# Altium integrated library Weidmueller_OMNIMATE_Power.IntLib: 508 symbols (part 6 of 9)
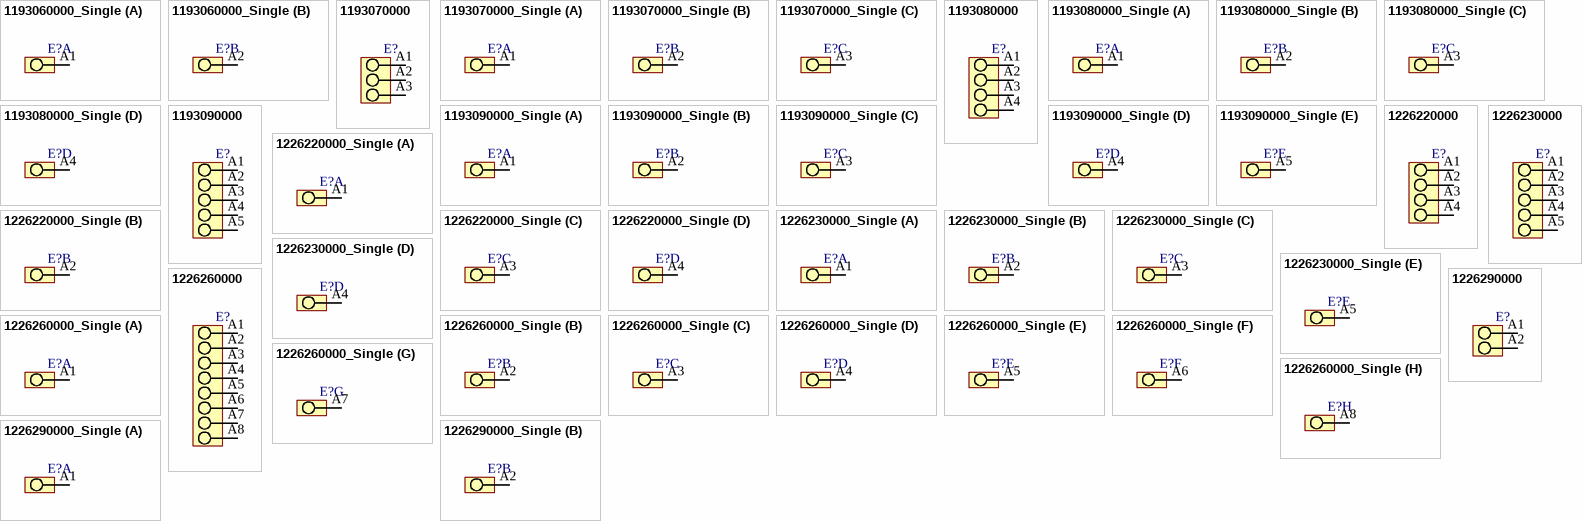
[diagram p36: symbols 1193060000_Single to 1226290000_Single]

## 1193090000_Single
designator E?
OMNIMATE Power - series LUP; PartNumber: 1193090000; Manufacturer: Weidmueller; Short_text_for_material: LUP 10.16/05/90V 3.2SN GY BX; Side_termination_characteristic: closed side; Mounting_onto_the_PCB: Solder connection; Pitch_mm: 10,16 mm; Pitch_inch: 0,4 inch; No_of_poles: 5; Solder_pin_length_mm: 3,2 mm; Contact_material: E-Cu; Contact_surface: tinned; Insulating_material: Wemid (PA); UL_94_flammability_rating: V-0; Rated_voltage_for_surge_voltage_class_pollution_degree_II_2: 1000 V; Rated_current_min_no_of_poles_TU_20_deg_C: 76 A; Solid_min_H05_07_V_U: 0,5 mm²; Solid_max_H05_07_V_U: 16 mm²; Rated_voltage_use_group_B_UL_1059: 600 V; Rated_current_use_group_B_UL_1059: 51 A; Wire_cross_section_AWG_min_UL_1059: AWG 22; Wire_cross_section_AWG_max_UL_1059: AWG 6; PackageReference: LUP_10_16_90V_05; Colour: Pebble grey; Packaging: Box; Qty: 20 PCS; Revision: V1; ComponentLink1Description: Manufacturer URL; ComponentLink1URL: http://www.weidmueller.com/; ComponentLink2Description: URL Link1; ComponentLink2URL: http://catalog.weidmueller.com/catalog/Start.do?localeId=en&ObjectID=1193090000
footprint LUP_10_16_90V_05 (OMNIMATE Power - Serie LUP  LUP 10.16/05/90V 3.2)
part A pins: A1
part B pins: A2
part C pins: A3
part D pins: A4
part E pins: A5
1 alternate drawing of the same symbol

## 1226220000
designator E?
OMNIMATE Power - series LU; PartNumber: 1226220000; Manufacturer: Weidmueller; Short_text_for_material: LU 10.16/04/90 4.5SN BK BX; Side_termination_characteristic: closed side; Mounting_onto_the_PCB: Solder connection; Pitch_mm: 10,16 mm; Pitch_inch: 0,4 inch; No_of_poles: 4; Solder_pin_length_mm: 4,5 mm; Contact_material: E-Cu; Contact_surface: tinned; Insulating_material: Wemid (PA); UL_94_flammability_rating: V-0; Rated_voltage_for_surge_voltage_class_pollution_degree_II_2: 1000 V; Solid_min_H05_07_V_U: 0,5 mm²; Solid_max_H05_07_V_U: 16 mm²; Rated_voltage_use_group_B_UL_1059: 300 V; Rated_current_use_group_B_UL_1059: 65 A; Wire_cross_section_AWG_min_UL_1059: AWG 26; Wire_cross_section_AWG_max_UL_1059: AWG 6; PackageReference: LU_10_16_90_04; Colour: Black; Packaging: Box; Qty: 20 PCS; Revision: V1; ComponentLink1Description: Manufacturer URL; ComponentLink1URL: http://www.weidmueller.com/; ComponentLink2Description: URL Link1; ComponentLink2URL: http://catalog.weidmueller.com/catalog/Start.do?localeId=en&ObjectID=1226220000
footprint LU_10_16_90_04 (OMNIMATE Power - Serie LU  LU 10.16/04/90 4.5)
pins: A1, A2, A3, A4
1 alternate drawing of the same symbol

## 1226220000_Single
designator E?
OMNIMATE Power - series LU; PartNumber: 1226220000; Manufacturer: Weidmueller; Short_text_for_material: LU 10.16/04/90 4.5SN BK BX; Side_termination_characteristic: closed side; Mounting_onto_the_PCB: Solder connection; Pitch_mm: 10,16 mm; Pitch_inch: 0,4 inch; No_of_poles: 4; Solder_pin_length_mm: 4,5 mm; Contact_material: E-Cu; Contact_surface: tinned; Insulating_material: Wemid (PA); UL_94_flammability_rating: V-0; Rated_voltage_for_surge_voltage_class_pollution_degree_II_2: 1000 V; Solid_min_H05_07_V_U: 0,5 mm²; Solid_max_H05_07_V_U: 16 mm²; Rated_voltage_use_group_B_UL_1059: 300 V; Rated_current_use_group_B_UL_1059: 65 A; Wire_cross_section_AWG_min_UL_1059: AWG 26; Wire_cross_section_AWG_max_UL_1059: AWG 6; PackageReference: LU_10_16_90_04; Colour: Black; Packaging: Box; Qty: 20 PCS; Revision: V1; ComponentLink1Description: Manufacturer URL; ComponentLink1URL: http://www.weidmueller.com/; ComponentLink2Description: URL Link1; ComponentLink2URL: http://catalog.weidmueller.com/catalog/Start.do?localeId=en&ObjectID=1226220000
footprint LU_10_16_90_04 (OMNIMATE Power - Serie LU  LU 10.16/04/90 4.5)
part A pins: A1
part B pins: A2
part C pins: A3
part D pins: A4
1 alternate drawing of the same symbol

## 1226230000
designator E?
OMNIMATE Power - series LU; PartNumber: 1226230000; Manufacturer: Weidmueller; Short_text_for_material: LU 10.16/05/90 4.5SN BK BX; Side_termination_characteristic: closed side; Mounting_onto_the_PCB: Solder connection; Pitch_mm: 10,16 mm; Pitch_inch: 0,4 inch; No_of_poles: 5; Solder_pin_length_mm: 4,5 mm; Contact_material: E-Cu; Contact_surface: tinned; Insulating_material: Wemid (PA); UL_94_flammability_rating: V-0; Rated_voltage_for_surge_voltage_class_pollution_degree_II_2: 1000 V; Solid_min_H05_07_V_U: 0,5 mm²; Solid_max_H05_07_V_U: 16 mm²; Rated_voltage_use_group_B_UL_1059: 300 V; Rated_current_use_group_B_UL_1059: 65 A; Wire_cross_section_AWG_min_UL_1059: AWG 26; Wire_cross_section_AWG_max_UL_1059: AWG 6; PackageReference: LU_10_16_90_05; Colour: Black; Packaging: Box; Qty: 20 PCS; Revision: V1; ComponentLink1Description: Manufacturer URL; ComponentLink1URL: http://www.weidmueller.com/; ComponentLink2Description: URL Link1; ComponentLink2URL: http://catalog.weidmueller.com/catalog/Start.do?localeId=en&ObjectID=1226230000
footprint LU_10_16_90_05 (OMNIMATE Power - Serie LU  LU 10.16/05/90 4.5)
pins: A1, A2, A3, A4, A5
1 alternate drawing of the same symbol

## 1226230000_Single
designator E?
OMNIMATE Power - series LU; PartNumber: 1226230000; Manufacturer: Weidmueller; Short_text_for_material: LU 10.16/05/90 4.5SN BK BX; Side_termination_characteristic: closed side; Mounting_onto_the_PCB: Solder connection; Pitch_mm: 10,16 mm; Pitch_inch: 0,4 inch; No_of_poles: 5; Solder_pin_length_mm: 4,5 mm; Contact_material: E-Cu; Contact_surface: tinned; Insulating_material: Wemid (PA); UL_94_flammability_rating: V-0; Rated_voltage_for_surge_voltage_class_pollution_degree_II_2: 1000 V; Solid_min_H05_07_V_U: 0,5 mm²; Solid_max_H05_07_V_U: 16 mm²; Rated_voltage_use_group_B_UL_1059: 300 V; Rated_current_use_group_B_UL_1059: 65 A; Wire_cross_section_AWG_min_UL_1059: AWG 26; Wire_cross_section_AWG_max_UL_1059: AWG 6; PackageReference: LU_10_16_90_05; Colour: Black; Packaging: Box; Qty: 20 PCS; Revision: V1; ComponentLink1Description: Manufacturer URL; ComponentLink1URL: http://www.weidmueller.com/; ComponentLink2Description: URL Link1; ComponentLink2URL: http://catalog.weidmueller.com/catalog/Start.do?localeId=en&ObjectID=1226230000
footprint LU_10_16_90_05 (OMNIMATE Power - Serie LU  LU 10.16/05/90 4.5)
part A pins: A1
part B pins: A2
part C pins: A3
part D pins: A4
part E pins: A5
1 alternate drawing of the same symbol

## 1226260000
designator E?
OMNIMATE Power - series LU; PartNumber: 1226260000; Manufacturer: Weidmueller; Short_text_for_material: LU 10.16/08/90 4.5SN BK BX; Side_termination_characteristic: closed side; Mounting_onto_the_PCB: Solder connection; Pitch_mm: 10,16 mm; Pitch_inch: 0,4 inch; No_of_poles: 8; Solder_pin_length_mm: 4,5 mm; Contact_material: E-Cu; Contact_surface: tinned; Insulating_material: Wemid (PA); UL_94_flammability_rating: V-0; Rated_voltage_for_surge_voltage_class_pollution_degree_II_2: 1000 V; Solid_min_H05_07_V_U: 0,5 mm²; Solid_max_H05_07_V_U: 16 mm²; Rated_voltage_use_group_B_UL_1059: 300 V; Rated_current_use_group_B_UL_1059: 65 A; Wire_cross_section_AWG_min_UL_1059: AWG 26; Wire_cross_section_AWG_max_UL_1059: AWG 6; PackageReference: LU_10_16_90_08; Colour: Black; Packaging: Box; Qty: 20 PCS; Revision: V1; ComponentLink1Description: Manufacturer URL; ComponentLink1URL: http://www.weidmueller.com/; ComponentLink2Description: URL Link1; ComponentLink2URL: http://catalog.weidmueller.com/catalog/Start.do?localeId=en&ObjectID=1226260000
footprint LU_10_16_90_08 (OMNIMATE Power - Serie LU  LU 10.16/08/90 4.5)
pins: A1, A2, A3, A4, A5, A6, A7, A8
1 alternate drawing of the same symbol

## 1226260000_Single
designator E?
OMNIMATE Power - series LU; PartNumber: 1226260000; Manufacturer: Weidmueller; Short_text_for_material: LU 10.16/08/90 4.5SN BK BX; Side_termination_characteristic: closed side; Mounting_onto_the_PCB: Solder connection; Pitch_mm: 10,16 mm; Pitch_inch: 0,4 inch; No_of_poles: 8; Solder_pin_length_mm: 4,5 mm; Contact_material: E-Cu; Contact_surface: tinned; Insulating_material: Wemid (PA); UL_94_flammability_rating: V-0; Rated_voltage_for_surge_voltage_class_pollution_degree_II_2: 1000 V; Solid_min_H05_07_V_U: 0,5 mm²; Solid_max_H05_07_V_U: 16 mm²; Rated_voltage_use_group_B_UL_1059: 300 V; Rated_current_use_group_B_UL_1059: 65 A; Wire_cross_section_AWG_min_UL_1059: AWG 26; Wire_cross_section_AWG_max_UL_1059: AWG 6; PackageReference: LU_10_16_90_08; Colour: Black; Packaging: Box; Qty: 20 PCS; Revision: V1; ComponentLink1Description: Manufacturer URL; ComponentLink1URL: http://www.weidmueller.com/; ComponentLink2Description: URL Link1; ComponentLink2URL: http://catalog.weidmueller.com/catalog/Start.do?localeId=en&ObjectID=1226260000
footprint LU_10_16_90_08 (OMNIMATE Power - Serie LU  LU 10.16/08/90 4.5)
part A pins: A1
part B pins: A2
part C pins: A3
part D pins: A4
part E pins: A5
part F pins: A6
part G pins: A7
part H pins: A8
1 alternate drawing of the same symbol

## 1226290000
designator E?
OMNIMATE Power - series LUP; PartNumber: 1226290000; Manufacturer: Weidmueller; Short_text_for_material: LUP 10.16/02/90 3.2SN BK BX; Side_termination_characteristic: closed side; Mounting_onto_the_PCB: Solder connection; Pitch_mm: 10,16 mm; Pitch_inch: 0,4 inch; No_of_poles: 2; Solder_pin_length_mm: 3,2 mm; Contact_material: E-Cu; Contact_surface: tinned; Insulating_material: Wemid (PA); UL_94_flammability_rating: V-0; Rated_voltage_for_surge_voltage_class_pollution_degree_II_2: 1000 V; Solid_min_H05_07_V_U: 0,5 mm²; Solid_max_H05_07_V_U: 16 mm²; Rated_voltage_use_group_B_UL_1059: 300 V; Rated_current_use_group_B_UL_1059: 58 A; Wire_cross_section_AWG_min_UL_1059: AWG 26; Wire_cross_section_AWG_max_UL_1059: AWG 6; PackageReference: LUP_10_16_90_02; Colour: Black; Packaging: Box; Qty: 20 PCS; Revision: V1; ComponentLink1Description: Manufacturer URL; ComponentLink1URL: http://www.weidmueller.com/; ComponentLink2Description: URL Link1; ComponentLink2URL: http://catalog.weidmueller.com/catalog/Start.do?localeId=en&ObjectID=1226290000
footprint LUP_10_16_90_02 (OMNIMATE Power - Serie LUP  LUP 10.16/02/90 3.2)
pins: A1, A2
1 alternate drawing of the same symbol

## 1226290000_Single
designator E?
OMNIMATE Power - series LUP; PartNumber: 1226290000; Manufacturer: Weidmueller; Short_text_for_material: LUP 10.16/02/90 3.2SN BK BX; Side_termination_characteristic: closed side; Mounting_onto_the_PCB: Solder connection; Pitch_mm: 10,16 mm; Pitch_inch: 0,4 inch; No_of_poles: 2; Solder_pin_length_mm: 3,2 mm; Contact_material: E-Cu; Contact_surface: tinned; Insulating_material: Wemid (PA); UL_94_flammability_rating: V-0; Rated_voltage_for_surge_voltage_class_pollution_degree_II_2: 1000 V; Solid_min_H05_07_V_U: 0,5 mm²; Solid_max_H05_07_V_U: 16 mm²; Rated_voltage_use_group_B_UL_1059: 300 V; Rated_current_use_group_B_UL_1059: 58 A; Wire_cross_section_AWG_min_UL_1059: AWG 26; Wire_cross_section_AWG_max_UL_1059: AWG 6; PackageReference: LUP_10_16_90_02; Colour: Black; Packaging: Box; Qty: 20 PCS; Revision: V1; ComponentLink1Description: Manufacturer URL; ComponentLink1URL: http://www.weidmueller.com/; ComponentLink2Description: URL Link1; ComponentLink2URL: http://catalog.weidmueller.com/catalog/Start.do?localeId=en&ObjectID=1226290000
footprint LUP_10_16_90_02 (OMNIMATE Power - Serie LUP  LUP 10.16/02/90 3.2)
part A pins: A1
part B pins: A2
1 alternate drawing of the same symbol

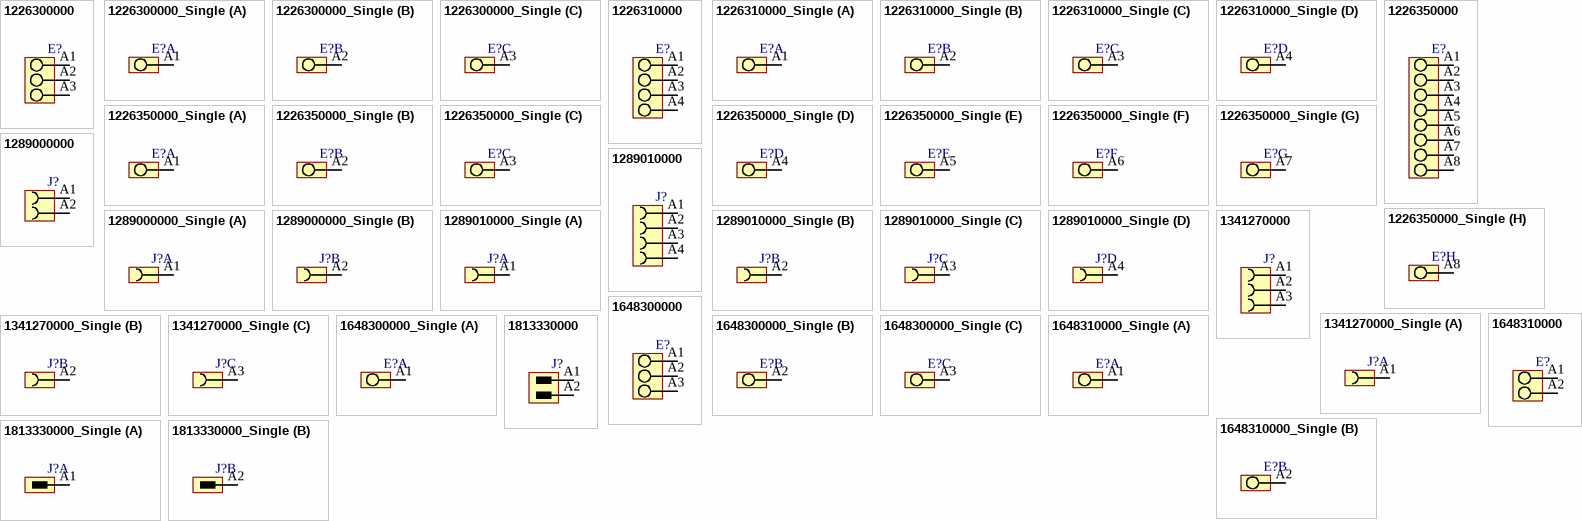
[diagram p20: symbols 1226300000 to 1813330000_Single]

## 1226300000
designator E?
OMNIMATE Power - series LUP; PartNumber: 1226300000; Manufacturer: Weidmueller; Short_text_for_material: LUP 10.16/03/90 3.2SN BK BX; Side_termination_characteristic: closed side; Mounting_onto_the_PCB: Solder connection; Pitch_mm: 10,16 mm; Pitch_inch: 0,4 inch; No_of_poles: 3; Solder_pin_length_mm: 3,2 mm; Contact_material: E-Cu; Contact_surface: tinned; Insulating_material: Wemid (PA); UL_94_flammability_rating: V-0; Rated_voltage_for_surge_voltage_class_pollution_degree_II_2: 1000 V; Solid_min_H05_07_V_U: 0,5 mm²; Solid_max_H05_07_V_U: 16 mm²; Rated_voltage_use_group_B_UL_1059: 300 V; Rated_current_use_group_B_UL_1059: 58 A; Wire_cross_section_AWG_min_UL_1059: AWG 26; Wire_cross_section_AWG_max_UL_1059: AWG 6; PackageReference: LUP_10_16_90_03; Colour: Black; Packaging: Box; Qty: 20 PCS; Revision: V1; ComponentLink1Description: Manufacturer URL; ComponentLink1URL: http://www.weidmueller.com/; ComponentLink2Description: URL Link1; ComponentLink2URL: http://catalog.weidmueller.com/catalog/Start.do?localeId=en&ObjectID=1226300000
footprint LUP_10_16_90_03 (OMNIMATE Power - Serie LUP  LUP 10.16/03/90 3.2)
pins: A1, A2, A3
1 alternate drawing of the same symbol

## 1226300000_Single
designator E?
OMNIMATE Power - series LUP; PartNumber: 1226300000; Manufacturer: Weidmueller; Short_text_for_material: LUP 10.16/03/90 3.2SN BK BX; Side_termination_characteristic: closed side; Mounting_onto_the_PCB: Solder connection; Pitch_mm: 10,16 mm; Pitch_inch: 0,4 inch; No_of_poles: 3; Solder_pin_length_mm: 3,2 mm; Contact_material: E-Cu; Contact_surface: tinned; Insulating_material: Wemid (PA); UL_94_flammability_rating: V-0; Rated_voltage_for_surge_voltage_class_pollution_degree_II_2: 1000 V; Solid_min_H05_07_V_U: 0,5 mm²; Solid_max_H05_07_V_U: 16 mm²; Rated_voltage_use_group_B_UL_1059: 300 V; Rated_current_use_group_B_UL_1059: 58 A; Wire_cross_section_AWG_min_UL_1059: AWG 26; Wire_cross_section_AWG_max_UL_1059: AWG 6; PackageReference: LUP_10_16_90_03; Colour: Black; Packaging: Box; Qty: 20 PCS; Revision: V1; ComponentLink1Description: Manufacturer URL; ComponentLink1URL: http://www.weidmueller.com/; ComponentLink2Description: URL Link1; ComponentLink2URL: http://catalog.weidmueller.com/catalog/Start.do?localeId=en&ObjectID=1226300000
footprint LUP_10_16_90_03 (OMNIMATE Power - Serie LUP  LUP 10.16/03/90 3.2)
part A pins: A1
part B pins: A2
part C pins: A3
1 alternate drawing of the same symbol

## 1226310000
designator E?
OMNIMATE Power - series LUP; PartNumber: 1226310000; Manufacturer: Weidmueller; Short_text_for_material: LUP 10.16/04/90 3.2SN BK BX; Side_termination_characteristic: closed side; Mounting_onto_the_PCB: Solder connection; Pitch_mm: 10,16 mm; Pitch_inch: 0,4 inch; No_of_poles: 4; Solder_pin_length_mm: 3,2 mm; Contact_material: E-Cu; Contact_surface: tinned; Insulating_material: Wemid (PA); UL_94_flammability_rating: V-0; Rated_voltage_for_surge_voltage_class_pollution_degree_II_2: 1000 V; Solid_min_H05_07_V_U: 0,5 mm²; Solid_max_H05_07_V_U: 16 mm²; Rated_voltage_use_group_B_UL_1059: 300 V; Rated_current_use_group_B_UL_1059: 58 A; Wire_cross_section_AWG_min_UL_1059: AWG 26; Wire_cross_section_AWG_max_UL_1059: AWG 6; PackageReference: LUP_10_16_90_04; Colour: Black; Packaging: Box; Qty: 20 PCS; Revision: V1; ComponentLink1Description: Manufacturer URL; ComponentLink1URL: http://www.weidmueller.com/; ComponentLink2Description: URL Link1; ComponentLink2URL: http://catalog.weidmueller.com/catalog/Start.do?localeId=en&ObjectID=1226310000
footprint LUP_10_16_90_04 (OMNIMATE Power - Serie LUP  LUP 10.16/04/90 3.2)
pins: A1, A2, A3, A4
1 alternate drawing of the same symbol

## 1226310000_Single
designator E?
OMNIMATE Power - series LUP; PartNumber: 1226310000; Manufacturer: Weidmueller; Short_text_for_material: LUP 10.16/04/90 3.2SN BK BX; Side_termination_characteristic: closed side; Mounting_onto_the_PCB: Solder connection; Pitch_mm: 10,16 mm; Pitch_inch: 0,4 inch; No_of_poles: 4; Solder_pin_length_mm: 3,2 mm; Contact_material: E-Cu; Contact_surface: tinned; Insulating_material: Wemid (PA); UL_94_flammability_rating: V-0; Rated_voltage_for_surge_voltage_class_pollution_degree_II_2: 1000 V; Solid_min_H05_07_V_U: 0,5 mm²; Solid_max_H05_07_V_U: 16 mm²; Rated_voltage_use_group_B_UL_1059: 300 V; Rated_current_use_group_B_UL_1059: 58 A; Wire_cross_section_AWG_min_UL_1059: AWG 26; Wire_cross_section_AWG_max_UL_1059: AWG 6; PackageReference: LUP_10_16_90_04; Colour: Black; Packaging: Box; Qty: 20 PCS; Revision: V1; ComponentLink1Description: Manufacturer URL; ComponentLink1URL: http://www.weidmueller.com/; ComponentLink2Description: URL Link1; ComponentLink2URL: http://catalog.weidmueller.com/catalog/Start.do?localeId=en&ObjectID=1226310000
footprint LUP_10_16_90_04 (OMNIMATE Power - Serie LUP  LUP 10.16/04/90 3.2)
part A pins: A1
part B pins: A2
part C pins: A3
part D pins: A4
1 alternate drawing of the same symbol

## 1226350000
designator E?
OMNIMATE Power - series LUP; PartNumber: 1226350000; Manufacturer: Weidmueller; Short_text_for_material: LUP 10.16/08/90 3.2SN BK BX; Side_termination_characteristic: closed side; Mounting_onto_the_PCB: Solder connection; Pitch_mm: 10,16 mm; Pitch_inch: 0,4 inch; No_of_poles: 8; Solder_pin_length_mm: 3,2 mm; Contact_material: E-Cu; Contact_surface: tinned; Insulating_material: Wemid (PA); UL_94_flammability_rating: V-0; Rated_voltage_for_surge_voltage_class_pollution_degree_II_2: 1000 V; Solid_min_H05_07_V_U: 0,5 mm²; Solid_max_H05_07_V_U: 16 mm²; Rated_voltage_use_group_B_UL_1059: 300 V; Rated_current_use_group_B_UL_1059: 58 A; Wire_cross_section_AWG_min_UL_1059: AWG 26; Wire_cross_section_AWG_max_UL_1059: AWG 6; PackageReference: LUP_10_16_90_08; Colour: Black; Packaging: Box; Qty: 20 PCS; Revision: V1; ComponentLink1Description: Manufacturer URL; ComponentLink1URL: http://www.weidmueller.com/; ComponentLink2Description: URL Link1; ComponentLink2URL: http://catalog.weidmueller.com/catalog/Start.do?localeId=en&ObjectID=1226350000
footprint LUP_10_16_90_08 (OMNIMATE Power - Serie LUP  LUP 10.16/08/90 3.2)
pins: A1, A2, A3, A4, A5, A6, A7, A8
1 alternate drawing of the same symbol

## 1226350000_Single
designator E?
OMNIMATE Power - series LUP; PartNumber: 1226350000; Manufacturer: Weidmueller; Short_text_for_material: LUP 10.16/08/90 3.2SN BK BX; Side_termination_characteristic: closed side; Mounting_onto_the_PCB: Solder connection; Pitch_mm: 10,16 mm; Pitch_inch: 0,4 inch; No_of_poles: 8; Solder_pin_length_mm: 3,2 mm; Contact_material: E-Cu; Contact_surface: tinned; Insulating_material: Wemid (PA); UL_94_flammability_rating: V-0; Rated_voltage_for_surge_voltage_class_pollution_degree_II_2: 1000 V; Solid_min_H05_07_V_U: 0,5 mm²; Solid_max_H05_07_V_U: 16 mm²; Rated_voltage_use_group_B_UL_1059: 300 V; Rated_current_use_group_B_UL_1059: 58 A; Wire_cross_section_AWG_min_UL_1059: AWG 26; Wire_cross_section_AWG_max_UL_1059: AWG 6; PackageReference: LUP_10_16_90_08; Colour: Black; Packaging: Box; Qty: 20 PCS; Revision: V1; ComponentLink1Description: Manufacturer URL; ComponentLink1URL: http://www.weidmueller.com/; ComponentLink2Description: URL Link1; ComponentLink2URL: http://catalog.weidmueller.com/catalog/Start.do?localeId=en&ObjectID=1226350000
footprint LUP_10_16_90_08 (OMNIMATE Power - Serie LUP  LUP 10.16/08/90 3.2)
part A pins: A1
part B pins: A2
part C pins: A3
part D pins: A4
part E pins: A5
part F pins: A6
part G pins: A7
part H pins: A8
1 alternate drawing of the same symbol

## 1289000000
designator J?
OMNIMATE Power - series BU/SU 10.16; PartNumber: 1289000000; Manufacturer: Weidmueller; Short_text_for_material: BUL 10.16HP/02/180 4.5AG BK BX SO; Side_termination_characteristic: closed side; Mounting_onto_the_PCB: Solder connection; Pitch_mm: 10.16 mm; Pitch_inch: 0.4 inch; No_of_poles: 2; Outgoing_elbow: 180°; Solder_pin_length_mm: 4.5 mm; Contact_material: Cu-Leg; Contact_surface: silver-plated; Insulating_material: PA GF; UL_94_flammability_rating: V-0; Rated_voltage_for_surge_voltage_class_pollution_degree_II_2: 1000 V; PackageReference: BUL_10_16HP_180G_02; Colour: Black; Packaging: Box; Qty: 50 PCS; Revision: V1; ComponentLink1Description: Manufacturer URL; ComponentLink1URL: http://www.weidmueller.com/; ComponentLink2Description: URL Link1; ComponentLink2URL: http://catalog.weidmueller.com/catalog/Start.do?localeId=en&ObjectID=1289000000
footprint BUL_10_16HP_180G_02 (OMNIMATE Power - Serie BU/SU 10.16  BUL 10.16HP/02/180 4.5)
pins: A1, A2

## 1289000000_Single
designator J?
OMNIMATE Power - series BU/SU 10.16; PartNumber: 1289000000; Manufacturer: Weidmueller; Short_text_for_material: BUL 10.16HP/02/180 4.5AG BK BX SO; Side_termination_characteristic: closed side; Mounting_onto_the_PCB: Solder connection; Pitch_mm: 10.16 mm; Pitch_inch: 0.4 inch; No_of_poles: 2; Outgoing_elbow: 180°; Solder_pin_length_mm: 4.5 mm; Contact_material: Cu-Leg; Contact_surface: silver-plated; Insulating_material: PA GF; UL_94_flammability_rating: V-0; Rated_voltage_for_surge_voltage_class_pollution_degree_II_2: 1000 V; PackageReference: BUL_10_16HP_180G_02; Colour: Black; Packaging: Box; Qty: 50 PCS; Revision: V1; ComponentLink1Description: Manufacturer URL; ComponentLink1URL: http://www.weidmueller.com/; ComponentLink2Description: URL Link1; ComponentLink2URL: http://catalog.weidmueller.com/catalog/Start.do?localeId=en&ObjectID=1289000000
footprint BUL_10_16HP_180G_02 (OMNIMATE Power - Serie BU/SU 10.16  BUL 10.16HP/02/180 4.5)
part A pins: A1
part B pins: A2

## 1289010000
designator J?
OMNIMATE Power - series BU/SU 10.16; PartNumber: 1289010000; Manufacturer: Weidmueller; Short_text_for_material: BUL 10.16HP/04/180 4.5AG BK BX SO; Side_termination_characteristic: closed side; Mounting_onto_the_PCB: Solder connection; Pitch_mm: 10.16 mm; Pitch_inch: 0.4 inch; No_of_poles: 4; Outgoing_elbow: 180°; Solder_pin_length_mm: 4.5 mm; Contact_material: Cu-Leg; Contact_surface: silver-plated; Insulating_material: PA GF; UL_94_flammability_rating: V-0; Rated_voltage_for_surge_voltage_class_pollution_degree_II_2: 1000 V; PackageReference: BUL_10_16HP_180G_04; Colour: Black; Packaging: Box; Qty: 50 PCS; Revision: V1; ComponentLink1Description: Manufacturer URL; ComponentLink1URL: http://www.weidmueller.com/; ComponentLink2Description: URL Link1; ComponentLink2URL: http://catalog.weidmueller.com/catalog/Start.do?localeId=en&ObjectID=1289010000
footprint BUL_10_16HP_180G_04 (OMNIMATE Power - Serie BU/SU 10.16  BUL 10.16HP/04/180 4.5)
pins: A1, A2, A3, A4

## 1289010000_Single
designator J?
OMNIMATE Power - series BU/SU 10.16; PartNumber: 1289010000; Manufacturer: Weidmueller; Short_text_for_material: BUL 10.16HP/04/180 4.5AG BK BX SO; Side_termination_characteristic: closed side; Mounting_onto_the_PCB: Solder connection; Pitch_mm: 10.16 mm; Pitch_inch: 0.4 inch; No_of_poles: 4; Outgoing_elbow: 180°; Solder_pin_length_mm: 4.5 mm; Contact_material: Cu-Leg; Contact_surface: silver-plated; Insulating_material: PA GF; UL_94_flammability_rating: V-0; Rated_voltage_for_surge_voltage_class_pollution_degree_II_2: 1000 V; PackageReference: BUL_10_16HP_180G_04; Colour: Black; Packaging: Box; Qty: 50 PCS; Revision: V1; ComponentLink1Description: Manufacturer URL; ComponentLink1URL: http://www.weidmueller.com/; ComponentLink2Description: URL Link1; ComponentLink2URL: http://catalog.weidmueller.com/catalog/Start.do?localeId=en&ObjectID=1289010000
footprint BUL_10_16HP_180G_04 (OMNIMATE Power - Serie BU/SU 10.16  BUL 10.16HP/04/180 4.5)
part A pins: A1
part B pins: A2
part C pins: A3
part D pins: A4

## 1341270000
designator J?
OMNIMATE Power - series BU/SU 10.16; PartNumber: 1341270000; Manufacturer: Weidmueller; Short_text_for_material: BUL 10.16HP/03/180 4.5AG BK BX SO; Side_termination_characteristic: closed side; Mounting_onto_the_PCB: Solder connection; Pitch_mm: 10.16 mm; Pitch_inch: 0.4 inch; No_of_poles: 3; Outgoing_elbow: 180°; Solder_pin_length_mm: 4.5 mm; Contact_material: Cu-Leg; Contact_surface: silver-plated; Insulating_material: PA GF; UL_94_flammability_rating: V-0; Rated_voltage_for_surge_voltage_class_pollution_degree_II_2: 1000 V; Rated_current_min_no_of_poles_TU_20_deg_C: 32 A; PackageReference: BUL_10_16HP_180G_03; Colour: Black; Packaging: Box; Qty: 50 PCS; Revision: V1; ComponentLink1Description: Manufacturer URL; ComponentLink1URL: http://www.weidmueller.com/; ComponentLink2Description: URL Link1; ComponentLink2URL: http://catalog.weidmueller.com/catalog/Start.do?localeId=en&ObjectID=1341270000
footprint BUL_10_16HP_180G_03 (OMNIMATE Power - Serie BU/SU 10.16  BUL 10.16HP/03/180 4.5)
pins: A1, A2, A3

## 1341270000_Single
designator J?
OMNIMATE Power - series BU/SU 10.16; PartNumber: 1341270000; Manufacturer: Weidmueller; Short_text_for_material: BUL 10.16HP/03/180 4.5AG BK BX SO; Side_termination_characteristic: closed side; Mounting_onto_the_PCB: Solder connection; Pitch_mm: 10.16 mm; Pitch_inch: 0.4 inch; No_of_poles: 3; Outgoing_elbow: 180°; Solder_pin_length_mm: 4.5 mm; Contact_material: Cu-Leg; Contact_surface: silver-plated; Insulating_material: PA GF; UL_94_flammability_rating: V-0; Rated_voltage_for_surge_voltage_class_pollution_degree_II_2: 1000 V; Rated_current_min_no_of_poles_TU_20_deg_C: 32 A; PackageReference: BUL_10_16HP_180G_03; Colour: Black; Packaging: Box; Qty: 50 PCS; Revision: V1; ComponentLink1Description: Manufacturer URL; ComponentLink1URL: http://www.weidmueller.com/; ComponentLink2Description: URL Link1; ComponentLink2URL: http://catalog.weidmueller.com/catalog/Start.do?localeId=en&ObjectID=1341270000
footprint BUL_10_16HP_180G_03 (OMNIMATE Power - Serie BU/SU 10.16  BUL 10.16HP/03/180 4.5)
part A pins: A1
part B pins: A2
part C pins: A3

## 1648300000
designator E?
OMNIMATE Power - series LU; PartNumber: 1648300000; Manufacturer: Weidmueller; Short_text_for_material: LU 10.16/03/90 4.5SN GY BX; Side_termination_characteristic: closed side; Mounting_onto_the_PCB: Solder connection; Pitch_mm: 10,16 mm; Pitch_inch: 0,4 inch; No_of_poles: 3; Solder_pin_length_mm: 4,5 mm; Contact_material: E-Cu; Contact_surface: tinned; Insulating_material: Wemid (PA); UL_94_flammability_rating: V-0; Rated_voltage_for_surge_voltage_class_pollution_degree_II_2: 1000 V; Rated_current_min_no_of_poles_TU_20_deg_C: 76 A; Solid_min_H05_07_V_U: 0,5 mm²; Solid_max_H05_07_V_U: 16 mm²; Rated_voltage_use_group_B_UL_1059: 300 V; Rated_current_use_group_B_UL_1059: 65 A; Wire_cross_section_AWG_min_UL_1059: AWG 26; Wire_cross_section_AWG_max_UL_1059: AWG 6; PackageReference: LU_10_16_90_03; Colour: Pebble grey; Packaging: Box; Qty: 20 PCS; Revision: V1; ComponentLink1Description: Manufacturer URL; ComponentLink1URL: http://www.weidmueller.com/; ComponentLink2Description: URL Link1; ComponentLink2URL: http://catalog.weidmueller.com/catalog/Start.do?localeId=en&ObjectID=1648300000
footprint LU_10_16_90_03 (OMNIMATE Power - Serie LU  LU 10.16/03/90 4.5)
pins: A1, A2, A3
1 alternate drawing of the same symbol

## 1648300000_Single
designator E?
OMNIMATE Power - series LU; PartNumber: 1648300000; Manufacturer: Weidmueller; Short_text_for_material: LU 10.16/03/90 4.5SN GY BX; Side_termination_characteristic: closed side; Mounting_onto_the_PCB: Solder connection; Pitch_mm: 10,16 mm; Pitch_inch: 0,4 inch; No_of_poles: 3; Solder_pin_length_mm: 4,5 mm; Contact_material: E-Cu; Contact_surface: tinned; Insulating_material: Wemid (PA); UL_94_flammability_rating: V-0; Rated_voltage_for_surge_voltage_class_pollution_degree_II_2: 1000 V; Rated_current_min_no_of_poles_TU_20_deg_C: 76 A; Solid_min_H05_07_V_U: 0,5 mm²; Solid_max_H05_07_V_U: 16 mm²; Rated_voltage_use_group_B_UL_1059: 300 V; Rated_current_use_group_B_UL_1059: 65 A; Wire_cross_section_AWG_min_UL_1059: AWG 26; Wire_cross_section_AWG_max_UL_1059: AWG 6; PackageReference: LU_10_16_90_03; Colour: Pebble grey; Packaging: Box; Qty: 20 PCS; Revision: V1; ComponentLink1Description: Manufacturer URL; ComponentLink1URL: http://www.weidmueller.com/; ComponentLink2Description: URL Link1; ComponentLink2URL: http://catalog.weidmueller.com/catalog/Start.do?localeId=en&ObjectID=1648300000
footprint LU_10_16_90_03 (OMNIMATE Power - Serie LU  LU 10.16/03/90 4.5)
part A pins: A1
part B pins: A2
part C pins: A3
1 alternate drawing of the same symbol

## 1648310000
designator E?
OMNIMATE Power - series LU; PartNumber: 1648310000; Manufacturer: Weidmueller; Short_text_for_material: LU 10.16/02/90 4.5SN GY BX; Side_termination_characteristic: closed side; Mounting_onto_the_PCB: Solder connection; Pitch_mm: 10,16 mm; Pitch_inch: 0,4 inch; No_of_poles: 2; Solder_pin_length_mm: 4,5 mm; Contact_material: E-Cu; Contact_surface: tinned; Insulating_material: Wemid (PA); UL_94_flammability_rating: V-0; Rated_voltage_for_surge_voltage_class_pollution_degree_II_2: 1000 V; Rated_current_min_no_of_poles_TU_20_deg_C: 76 A; Solid_min_H05_07_V_U: 0,5 mm²; Solid_max_H05_07_V_U: 16 mm²; Rated_voltage_use_group_B_UL_1059: 300 V; Rated_current_use_group_B_UL_1059: 65 A; Wire_cross_section_AWG_min_UL_1059: AWG 26; Wire_cross_section_AWG_max_UL_1059: AWG 6; PackageReference: LU_10_16_90_02; Colour: Pebble grey; Packaging: Box; Qty: 20 PCS; Revision: V1; ComponentLink1Description: Manufacturer URL; ComponentLink1URL: http://www.weidmueller.com/; ComponentLink2Description: URL Link1; ComponentLink2URL: http://catalog.weidmueller.com/catalog/Start.do?localeId=en&ObjectID=1648310000
footprint LU_10_16_90_02 (OMNIMATE Power - Serie LU  LU 10.16/02/90 4.5)
pins: A1, A2
1 alternate drawing of the same symbol

## 1648310000_Single
designator E?
OMNIMATE Power - series LU; PartNumber: 1648310000; Manufacturer: Weidmueller; Short_text_for_material: LU 10.16/02/90 4.5SN GY BX; Side_termination_characteristic: closed side; Mounting_onto_the_PCB: Solder connection; Pitch_mm: 10,16 mm; Pitch_inch: 0,4 inch; No_of_poles: 2; Solder_pin_length_mm: 4,5 mm; Contact_material: E-Cu; Contact_surface: tinned; Insulating_material: Wemid (PA); UL_94_flammability_rating: V-0; Rated_voltage_for_surge_voltage_class_pollution_degree_II_2: 1000 V; Rated_current_min_no_of_poles_TU_20_deg_C: 76 A; Solid_min_H05_07_V_U: 0,5 mm²; Solid_max_H05_07_V_U: 16 mm²; Rated_voltage_use_group_B_UL_1059: 300 V; Rated_current_use_group_B_UL_1059: 65 A; Wire_cross_section_AWG_min_UL_1059: AWG 26; Wire_cross_section_AWG_max_UL_1059: AWG 6; PackageReference: LU_10_16_90_02; Colour: Pebble grey; Packaging: Box; Qty: 20 PCS; Revision: V1; ComponentLink1Description: Manufacturer URL; ComponentLink1URL: http://www.weidmueller.com/; ComponentLink2Description: URL Link1; ComponentLink2URL: http://catalog.weidmueller.com/catalog/Start.do?localeId=en&ObjectID=1648310000
footprint LU_10_16_90_02 (OMNIMATE Power - Serie LU  LU 10.16/02/90 4.5)
part A pins: A1
part B pins: A2
1 alternate drawing of the same symbol

## 1813330000
designator J?
OMNIMATE Power - series BU/SU 10.16HP; PartNumber: 1813330000; Manufacturer: Weidmueller; Short_text_for_material: SU 10.16HP/02/90G 3.5AG BK BX; Side_termination_characteristic: closed side; Mounting_onto_the_PCB: Solder connection; Pitch_mm: 10.16 mm; Pitch_inch: 0.4 inch; No_of_poles: 2; Outgoing_elbow: 90°; Solder_pin_length_mm: 3.5 mm; Contact_material: Cu-Leg; Contact_surface: silver-plated; Insulating_material: PBT GF; UL_94_flammability_rating: V-0; Rated_voltage_for_surge_voltage_class_pollution_degree_II_2: 1000 V; Rated_current_min_no_of_poles_TU_20_deg_C: 19 A; Rated_voltage_use_group_B_UL_1059: 300 V; Rated_current_use_group_B_UL_1059: 54 A; PackageReference: SU_10_16HP_90G_02; Colour: Black; Packaging: Box; Qty: 50 PCS; Revision: V1; ComponentLink1Description: Manufacturer URL; ComponentLink1URL: http://www.weidmueller.com/; ComponentLink2Description: URL Link1; ComponentLink2URL: http://catalog.weidmueller.com/catalog/Start.do?localeId=en&ObjectID=1813330000
footprint SU_10_16HP_90G_02 (OMNIMATE Power - Serie BU/SU 10.16HP  SU 10.16HP/02/90G 3.5)
pins: A1, A2

## 1813330000_Single
designator J?
OMNIMATE Power - series BU/SU 10.16HP; PartNumber: 1813330000; Manufacturer: Weidmueller; Short_text_for_material: SU 10.16HP/02/90G 3.5AG BK BX; Side_termination_characteristic: closed side; Mounting_onto_the_PCB: Solder connection; Pitch_mm: 10.16 mm; Pitch_inch: 0.4 inch; No_of_poles: 2; Outgoing_elbow: 90°; Solder_pin_length_mm: 3.5 mm; Contact_material: Cu-Leg; Contact_surface: silver-plated; Insulating_material: PBT GF; UL_94_flammability_rating: V-0; Rated_voltage_for_surge_voltage_class_pollution_degree_II_2: 1000 V; Rated_current_min_no_of_poles_TU_20_deg_C: 19 A; Rated_voltage_use_group_B_UL_1059: 300 V; Rated_current_use_group_B_UL_1059: 54 A; PackageReference: SU_10_16HP_90G_02; Colour: Black; Packaging: Box; Qty: 50 PCS; Revision: V1; ComponentLink1Description: Manufacturer URL; ComponentLink1URL: http://www.weidmueller.com/; ComponentLink2Description: URL Link1; ComponentLink2URL: http://catalog.weidmueller.com/catalog/Start.do?localeId=en&ObjectID=1813330000
footprint SU_10_16HP_90G_02 (OMNIMATE Power - Serie BU/SU 10.16HP  SU 10.16HP/02/90G 3.5)
part A pins: A1
part B pins: A2

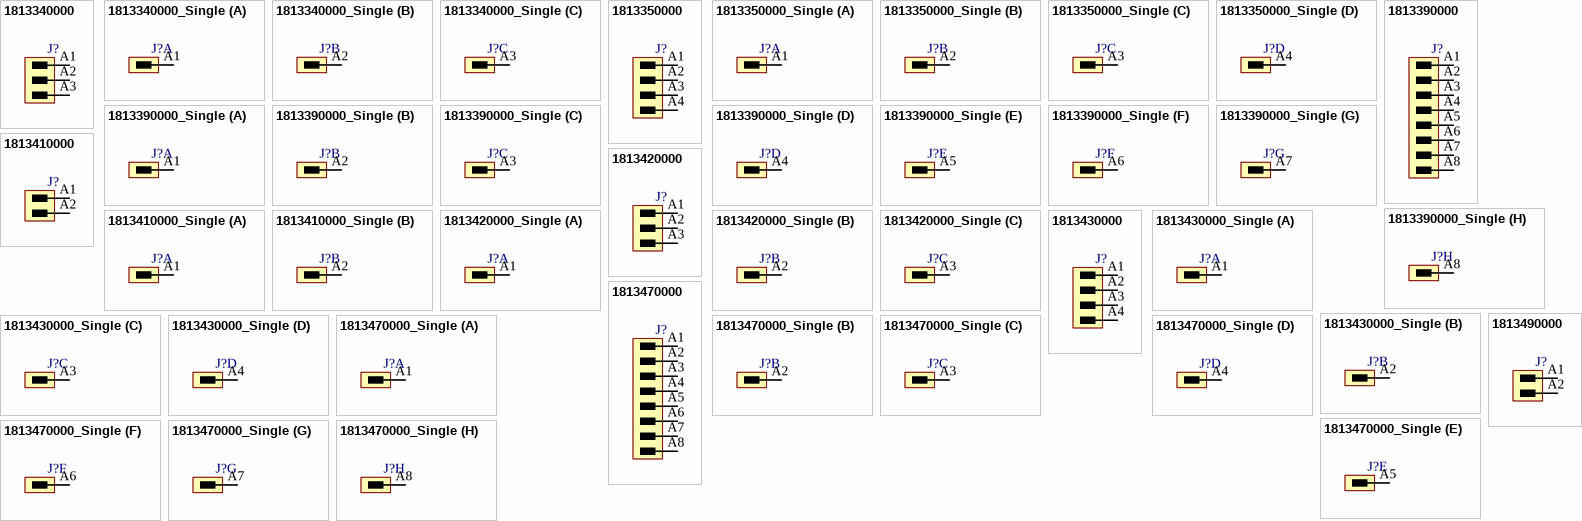
[diagram p21: symbols 1813340000 to 1813490000]

## 1813340000
designator J?